# Altium integrated library WE-CMB_rev16a.intlib: 33 symbols
Pins are listed as number, name and electrical type; pins without a type are passive.

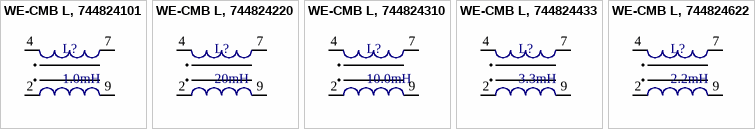
[diagram p0: symbols WE-CMB L, 744824101 to WE-CMB L, 744824622]

## WE-CMB L, 744824101
designator L?, comment 1.0mH
WE-CMB Common Mode Power Line Choke, L = 1.0mH; partNo: 744824101; Manufacturer: Wurth Elektronik; Inductance: 1.0mH; ComponentLink1Description: Manufacturer; ComponentLink1URL: http://www.we-online.de; Created by: Baojun Chen; Created Date: Feb.2016; ComponentLink2Description: Datasheet; ComponentLink2URL: http://katalog.we-online.de/pbs/datasheet/744824101.pdf
footprint WE-CMB_L (THT Inductor, 4-Leads, Body 27,5x18,5mm)
pins: 2, 4, 7, 9

## WE-CMB L, 744824220
designator L?, comment 20mH
WE-CMB Common Mode Power Line Choke, L = 20mH; partNo: 744824220; Manufacturer: Wurth Elektronik; Inductance: 20mH; ComponentLink1Description: Manufacturer; ComponentLink1URL: http://www.we-online.de; Created by: Baojun Chen; Created Date: Feb.2016; ComponentLink2Description: Datasheet; ComponentLink2URL: http://katalog.we-online.de/pbs/datasheet/744824220.pdf
footprint WE-CMB_L (THT Inductor, 4-Leads, Body 27,5x18,5mm)
pins: 2, 4, 7, 9

## WE-CMB L, 744824310
designator L?, comment 10.0mH
WE-CMB Common Mode Power Line Choke, L = 10.0mH; partNo: 744824310; Manufacturer: Wurth Elektronik; Inductance: 10.0mH; ComponentLink1Description: Manufacturer; ComponentLink1URL: http://www.we-online.de; Created by: Baojun Chen; Created Date: Feb.2016; ComponentLink2Description: Datasheet; ComponentLink2URL: http://katalog.we-online.de/pbs/datasheet/744824310.pdf
footprint WE-CMB_L (THT Inductor, 4-Leads, Body 27,5x18,5mm)
pins: 2, 4, 7, 9

## WE-CMB L, 744824433
designator L?, comment 3.3mH
WE-CMB Common Mode Power Line Choke, L = 3.3mH; partNo: 744824433; Manufacturer: Wurth Elektronik; Inductance: 3.3mH; ComponentLink1Description: Manufacturer; ComponentLink1URL: http://www.we-online.de; Created by: Baojun Chen; Created Date: Feb.2016; ComponentLink2Description: Datasheet; ComponentLink2URL: http://katalog.we-online.de/pbs/datasheet/744824433.pdf
footprint WE-CMB_L (THT Inductor, 4-Leads, Body 27,5x18,5mm)
pins: 2, 4, 7, 9

## WE-CMB L, 744824622
designator L?, comment 2.2mH
WE-CMB Common Mode Power Line Choke, L = 2.2mH; partNo: 744824622; Manufacturer: Wurth Elektronik; Inductance: 2.2mH; ComponentLink1Description: Manufacturer; ComponentLink1URL: http://www.we-online.de; Created by: Baojun Chen; Created Date: Feb.2016; ComponentLink2Description: Datasheet; ComponentLink2URL: http://katalog.we-online.de/pbs/datasheet/744824622.pdf
footprint WE-CMB_L (THT Inductor, 4-Leads, Body 27,5x18,5mm)
pins: 2, 4, 7, 9


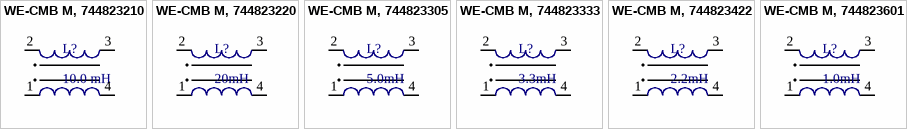
[diagram p1: symbols WE-CMB M, 744823210 to WE-CMB M, 744823601]

## WE-CMB M, 744823210
designator L?, comment 10.0 mH
WE-CMB Common Mode Power Line Choke, L = 10mH; partNo: 744823210; Manufacturer: Wurth Elektronik; Inductance: 10.0 mH; ComponentLink1Description: Manufacturer; ComponentLink1URL: http://www.we-online.de; Created by: Baojun Chen; Created Date: Feb.2016; ComponentLink2Description: Datasheet; ComponentLink2URL: http://katalog.we-online.de/pbs/datasheet/744823210.pdf
footprint WE-CMB_M_744823210 (THT Inductor, 4-Leads, Body 23,0x13.8,0mm)
pins: 1, 2, 3, 4

## WE-CMB M, 744823220
designator L?, comment 20mH
WE-CMB Common Mode Power Line Choke, L = 20mH; partNo: 744823220; Manufacturer: Wurth Elektronik; Inductance: 20mH; ComponentLink1Description: Manufacturer; ComponentLink1URL: http://www.we-online.de; Created by: Baojun Chen; Created Date: Feb.2016; ComponentLink2Description: Datasheet; ComponentLink2URL: http://katalog.we-online.de/pbs/datasheet/744823220.pdf
footprint WE-CMB_M_744823220 (THT Inductor, 4-Leads, Body 23,0x13.8mm)
pins: 1, 2, 3, 4

## WE-CMB M, 744823305
designator L?, comment 5.0mH
WE-CMB Common Mode Power Line Choke, L = 5.0mH; partNo: 744823305; Manufacturer: Wurth Elektronik; Inductance: 5.0mH; ComponentLink1Description: Manufacturer; ComponentLink1URL: http://www.we-online.de; Created by: Baojun Chen; Created Date: Feb.2016; ComponentLink2Description: Datasheet; ComponentLink2URL: http://katalog.we-online.de/pbs/datasheet/744823305.pdf
footprint WE-CMB_M_744823305 (THT Inductor, 4-Leads, Body 23,0x13.0mm)
pins: 1, 2, 3, 4

## WE-CMB M, 744823333
designator L?, comment 3.3mH
WE-CMB Common Mode Power Line Choke, L = 3.3mH; partNo: 744823333; Manufacturer: Wurth Elektronik; Inductance: 3.3mH; ComponentLink1Description: Manufacturer; ComponentLink1URL: http://www.we-online.de; Created by: Baojun Chen; Created Date: Feb.2016; ComponentLink2Description: Datasheet; ComponentLink2URL: http://katalog.we-online.de/pbs/datasheet/744823333.pdf
footprint WE-CMB_M_744823333 (THT Inductor, 4-Leads, Body 23,5x13.0mm)
pins: 1, 2, 3, 4

## WE-CMB M, 744823422
designator L?, comment 2.2mH
WE-CMB Common Mode Power Line Choke, L = 2.2mH; partNo: 744823422; Manufacturer: Wurth Elektronik; Inductance: 2.2mH; ComponentLink1Description: Manufacturer; ComponentLink1URL: http://www.we-online.de; Created by: Baojun Chen; Created Date: Feb.2016; ComponentLink2Description: Datasheet; ComponentLink2URL: http://katalog.we-online.de/pbs/datasheet/744823422.pdf
footprint WE-CMB_M_744823422 (THT Inductor, 4-Leads, Body 23,5x13.8mm)
pins: 1, 2, 3, 4

## WE-CMB M, 744823601
designator L?, comment 1.0mH
WE-CMB Common Mode Power Line Choke, L = 1.0mH; partNo: 744823601; Manufacturer: Wurth Elektronik; Inductance: 1.0mH; ComponentLink1Description: Manufacturer; ComponentLink1URL: http://www.we-online.de; Created by: Baojun Chen; Created Date: Feb.2016; ComponentLink2Description: Datasheet; ComponentLink2URL: http://katalog.we-online.de/pbs/datasheet/744823601.pdf
footprint WE-CMB_M_744823601 (THT Inductor, 4-Leads, Body 25.0x17mm)
pins: 1, 2, 3, 4


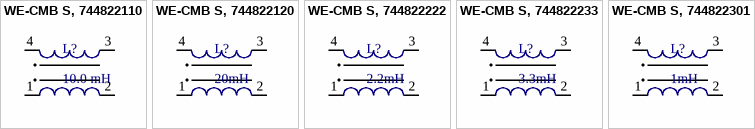
[diagram p2: symbols WE-CMB S, 744822110 to WE-CMB S, 744822301]

## WE-CMB S, 744822110
designator L?, comment 10.0 mH
WE-CMB Common Mode Power Line Choke, L = 10mH; partNo: 744822110; Manufacturer: Wurth Elektronik; Inductance: 10.0 mH; ComponentLink1Description: Manufacturer; ComponentLink1URL: http://www.we-online.de; Created by: Baojun Chen; Created Date: Feb.2016; ComponentLink2Description: Datasheet; ComponentLink2URL: http://katalog.we-online.de/pbs/datasheet/744822110.pdf
footprint WE-CMB_S (THT Inductor, 4-Leads, Body 17,5x13,0mm)
pins: 1, 2, 3, 4

## WE-CMB S, 744822120
designator L?, comment 20mH
WE-CMB Common Mode Power Line Choke, L = 20mH; partNo: 744822120; Manufacturer: Wurth Elektronik; Inductance: 20mH; ComponentLink1Description: Manufacturer; ComponentLink1URL: http://www.we-online.de; Created by: Baojun Chen; Created Date: Feb.2016; ComponentLink2Description: Datasheet; ComponentLink2URL: http://katalog.we-online.de/pbs/datasheet/744822120.pdf
footprint WE-CMB_S (THT Inductor, 4-Leads, Body 17,5x13,0mm)
pins: 1, 2, 3, 4

## WE-CMB S, 744822222
designator L?, comment 2.2mH
WE-CMB Common Mode Power Line Choke, L = 2.2mH; partNo: 744822222; Manufacturer: Wurth Elektronik; Inductance: 2.2mH; ComponentLink1Description: Manufacturer; ComponentLink1URL: http://www.we-online.de; Created by: Baojun Chen; Created Date: Feb.2016; ComponentLink2Description: Datasheet; ComponentLink2URL: http://katalog.we-online.de/pbs/datasheet/744822222.pdf
footprint WE-CMB_S (THT Inductor, 4-Leads, Body 17,5x13,0mm)
pins: 1, 2, 3, 4

## WE-CMB S, 744822233
designator L?, comment 3.3mH
WE-CMB Common Mode Power Line Choke, L = 3.3mH; partNo: 744822233; Manufacturer: Wurth Elektronik; Inductance: 3.3mH; ComponentLink1Description: Manufacturer; ComponentLink1URL: http://www.we-online.de; Created by: Baojun Chen; Created Date: Feb.2016; ComponentLink2Description: Datasheet; ComponentLink2URL: http://katalog.we-online.de/pbs/datasheet/744822233.pdf
footprint WE-CMB_S (THT Inductor, 4-Leads, Body 17,5x13,0mm)
pins: 1, 2, 3, 4

## WE-CMB S, 744822301
designator L?, comment 1mH
WE-CMB Common Mode Power Line Choke, L = 1mH; partNo: 744822301; Manufacturer: Wurth Elektronik; Inductance: 1mH; ComponentLink1Description: Manufacturer; ComponentLink1URL: http://www.we-online.de; Created by: Baojun Chen; Created Date: Feb.2016; ComponentLink2Description: Datasheet; ComponentLink2URL: http://katalog.we-online.de/pbs/datasheet/744822301.pdf
footprint WE-CMB_S (THT Inductor, 4-Leads, Body 17,5x13,0mm)
pins: 1, 2, 3, 4


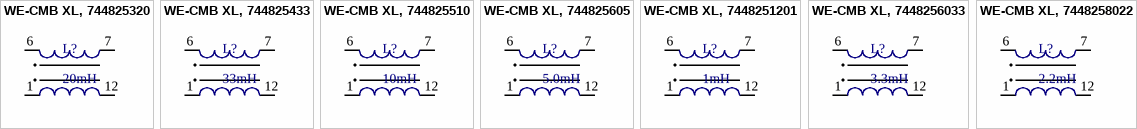
[diagram p3: symbols WE-CMB XL, 744825320 to WE-CMB XL, 7448258022]

## WE-CMB XL, 744825320
designator L?, comment 20mH
WE-CMB Common Mode Power Line Choke, L = 20mH; partNo: 744825320; Manufacturer: Wurth Elektronik; Inductance: 20mH; ComponentLink1Description: Manufacturer; ComponentLink1URL: http://www.we-online.de; Created by: Baojun Chen; Created Date: Feb.2016; ComponentLink2Description: Datasheet; ComponentLink2URL: http://katalog.we-online.de/pbs/datasheet/744825320.pdf
footprint WE-CMB_XL (THT Inductor, 4-Leads, Body 30,0x21,0mm)
pins: 1, 6, 7, 12

## WE-CMB XL, 744825433
designator L?, comment 33mH
WE-CMB Common Mode Power Line Choke, L = 33mH; partNo: 744825433; Manufacturer: Wurth Elektronik; Inductance: 33mH; ComponentLink1Description: Manufacturer; ComponentLink1URL: http://www.we-online.de; Created by: Baojun Chen; Created Date: Feb.2016; ComponentLink2Description: Datasheet; ComponentLink2URL: http://katalog.we-online.de/pbs/datasheet/744825433.pdf
footprint WE-CMB_XL (THT Inductor, 4-Leads, Body 30,0x21,0mm)
pins: 1, 6, 7, 12

## WE-CMB XL, 744825510
designator L?, comment 10mH
WE-CMB Common Mode Power Line Choke, L = 10mH; partNo: 744825510; Manufacturer: Wurth Elektronik; Inductance: 10mH; ComponentLink1Description: Manufacturer; ComponentLink1URL: http://www.we-online.de; Created by: Baojun Chen; Created Date: Feb.2016; ComponentLink2Description: Datasheet; ComponentLink2URL: http://katalog.we-online.de/pbs/datasheet/744825510.pdf
footprint WE-CMB_XL (THT Inductor, 4-Leads, Body 30,0x21,0mm)
pins: 1, 6, 7, 12

## WE-CMB XL, 744825605
designator L?, comment 5.0mH
WE-CMB Common Mode Power Line Choke, L = 5.0mH; partNo: 744825605; Manufacturer: Wurth Elektronik; Inductance: 5.0mH; ComponentLink1Description: Manufacturer; ComponentLink1URL: http://www.we-online.de; Created by: Baojun Chen; Created Date: Feb.2016; ComponentLink2Description: Datasheet; ComponentLink2URL: http://katalog.we-online.de/pbs/datasheet/744825605.pdf
footprint WE-CMB_XL (THT Inductor, 4-Leads, Body 30,0x21,0mm)
pins: 1, 6, 7, 12

## WE-CMB XL, 7448251201
designator L?, comment 1mH
WE-CMB Common Mode Power Line Choke, L = 1mH; partNo: 7448251201; Manufacturer: Wurth Elektronik; Inductance: 1mH; ComponentLink1Description: Manufacturer; ComponentLink1URL: http://www.we-online.de; Created by: Baojun Chen; Created Date: Feb.2016; ComponentLink2Description: Datasheet; ComponentLink2URL: http://katalog.we-online.de/pbs/datasheet/7448251201.pdf
footprint WE-CMB_XL_7448251201 (THT Inductor, 4-Leads, Body 31,0x22,0mm)
pins: 1, 6, 7, 12

## WE-CMB XL, 7448256033
designator L?, comment 3.3mH
WE-CMB Common Mode Power Line Choke, L = 3.3mH; partNo: 7448256033; Manufacturer: Wurth Elektronik; Inductance: 3.3mH; ComponentLink1Description: Manufacturer; ComponentLink1URL: http://www.we-online.de; Created by: Baojun Chen; Created Date: Feb.2016; ComponentLink2Description: Datasheet; ComponentLink2URL: http://katalog.we-online.de/pbs/datasheet/7448256033.pdf
footprint WE-CMB_XL (THT Inductor, 4-Leads, Body 30,0x21,0mm)
pins: 1, 6, 7, 12

## WE-CMB XL, 7448258022
designator L?, comment 2.2mH
WE-CMB Common Mode Power Line Choke, L = 2.2mH; partNo: 7448258022; Manufacturer: Wurth Elektronik; Inductance: 2.2mH; ComponentLink1Description: Manufacturer; ComponentLink1URL: http://www.we-online.de; Created by: Baojun Chen; Created Date: Feb.2016; ComponentLink2Description: Datasheet; ComponentLink2URL: http://katalog.we-online.de/pbs/datasheet/7448258022.pdf
footprint WE-CMB_XL (THT Inductor, 4-Leads, Body 30,0x21,0mm)
pins: 1, 6, 7, 12


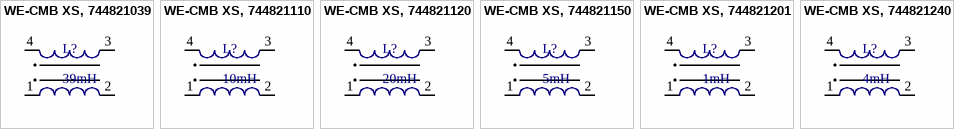
[diagram p4: symbols WE-CMB XS, 744821039 to WE-CMB XS, 744821240]

## WE-CMB XS, 744821039
designator L?, comment 39mH
WE-CMB Common Mode Power Line Choke, L = 39mH; partNo: 744821039; Manufacturer: Wurth Elektronik; Inductance: 39mH; ComponentLink1Description: Manufacturer; ComponentLink1URL: http://www.we-online.de; Created by: Baojun Chen; Created Date: Feb.2016; ComponentLink2Description: Datasheet; ComponentLink2URL: http://katalog.we-online.de/pbs/datasheet/744821039.pdf
footprint WE-CMB_XS (THT Inductor, 2-Leads, Body 15,0x7,5mm)
pins: 1, 2, 3, 4

## WE-CMB XS, 744821110
designator L?, comment 10mH
WE-CMB Common Mode Power Line Choke, L = 10mH; partNo: 744821110; Manufacturer: Wurth Elektronik; Inductance: 10mH; ComponentLink1Description: Manufacturer; ComponentLink1URL: http://www.we-online.de; Created by: Baojun Chen; Created Date: Feb.2016; ComponentLink2Description: Datasheet; ComponentLink2URL: http://katalog.we-online.de/pbs/datasheet/744821110.pdf
footprint WE-CMB_XS (THT Inductor, 2-Leads, Body 15,0x7,5mm)
pins: 1, 2, 3, 4

## WE-CMB XS, 744821120
designator L?, comment 20mH
WE-CMB Common Mode Power Line Choke, L = 20mH; partNo: 744821120; Manufacturer: Wurth Elektronik; Inductance: 20mH; ComponentLink1Description: Manufacturer; ComponentLink1URL: http://www.we-online.de; Created by: Baojun Chen; Created Date: Feb.2016; ComponentLink2Description: Datasheet; ComponentLink2URL: http://katalog.we-online.de/pbs/datasheet/744821120.pdf
footprint WE-CMB_XS_744821120 (THT Inductor, 2-Leads, Body 15,0x7,8mm)
pins: 1, 2, 3, 4

## WE-CMB XS, 744821150
designator L?, comment 5mH
WE-CMB Common Mode Power Line Choke, L = 5mH; partNo: 744821150; Manufacturer: Wurth Elektronik; Inductance: 5mH; ComponentLink1Description: Manufacturer; ComponentLink1URL: http://www.we-online.de; Created by: Baojun Chen; Created Date: Feb.2016; ComponentLink2Description: Datasheet; ComponentLink2URL: http://katalog.we-online.de/pbs/datasheet/744821150.pdf
footprint WE-CMB_XS_744821150 (THT Inductor, 2-Leads, Body 15,0x7,8mm)
pins: 1, 2, 3, 4

## WE-CMB XS, 744821201
designator L?, comment 1mH
WE-CMB Common Mode Power Line Choke, L = 1mH; partNo: 744821201; Manufacturer: Wurth Elektronik; Inductance: 1mH; ComponentLink1Description: Manufacturer; ComponentLink1URL: http://www.we-online.de; Created by: Baojun Chen; Created Date: Feb.2016; ComponentLink2Description: Datasheet; ComponentLink2URL: http://katalog.we-online.de/pbs/datasheet/744821201.pdf
footprint WE-CMB_XS (THT Inductor, 2-Leads, Body 15,0x7,5mm)
pins: 1, 2, 3, 4

## WE-CMB XS, 744821240
designator L?, comment 4mH
WE-CMB Common Mode Power Line Choke, L = 4mH; partNo: 744821240; Manufacturer: Wurth Elektronik; Inductance: 4mH; ComponentLink1Description: Manufacturer; ComponentLink1URL: http://www.we-online.de; Created by: Baojun Chen; Created Date: Feb.2016; ComponentLink2Description: Datasheet; ComponentLink2URL: http://katalog.we-online.de/pbs/datasheet/744821240.pdf
footprint WE-CMB_XS_744821240 (THT Inductor, 2-Leads, Body 15,8x7,8mm)
pins: 1, 2, 3, 4


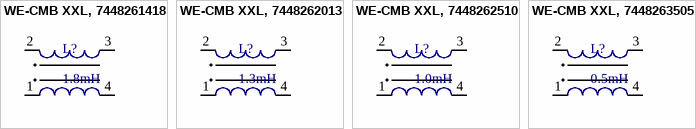
[diagram p5: symbols WE-CMB XXL, 7448261418 to WE-CMB XXL, 7448263505]

## WE-CMB XXL, 7448261418
designator L?, comment 1.8mH
WE-CMB Common Mode Power Line Choke, L = 1.8mH; partNo: 7448261418; Manufacturer: Wurth Elektronik; Inductance: 1.8mH; ComponentLink1Description: Manufacturer; ComponentLink1URL: http://www.we-online.de; Created by: Baojun Chen; Created Date: Feb.2016; ComponentLink2Description: Datasheet; ComponentLink2URL: http://katalog.we-online.de/pbs/datasheet/7448261418.pdf
footprint WE-CMB_XXL_7448261418 (THT Inductor, 4-Leads, Body 43,0x23,5mm)
pins: 1, 2, 3, 4

## WE-CMB XXL, 7448262013
designator L?, comment 1.3mH
WE-CMB Common Mode Power Line Choke, L = 1.3mH; partNo: 7448262013; Manufacturer: Wurth Elektronik; Inductance: 1.3mH; ComponentLink1Description: Manufacturer; ComponentLink1URL: http://www.we-online.de; Created by: Baojun Chen; Created Date: Feb.2016; ComponentLink2Description: Datasheet; ComponentLink2URL: http://katalog.we-online.de/pbs/datasheet/7448262013.pdf
footprint WE-CMB_XXL_7448262013 (THT Inductor, 4-Leads, Body 43,5x23,5mm)
pins: 1, 2, 3, 4

## WE-CMB XXL, 7448262510
designator L?, comment 1.0mH
WE-CMB Common Mode Power Line Choke, L = 1.0mH; partNo: 7448262510; Manufacturer: Wurth Elektronik; Inductance: 1.0mH; ComponentLink1Description: Manufacturer; ComponentLink1URL: http://www.we-online.de; Created by: Baojun Chen; Created Date: Feb.2016; ComponentLink2Description: Datasheet; ComponentLink2URL: http://katalog.we-online.de/pbs/datasheet/7448262510.pdf
footprint WE-CMB_XXL_7448262510 (THT Inductor, 4-Leads, Body 44,0x23,5mm)
pins: 1, 2, 3, 4

## WE-CMB XXL, 7448263505
designator L?, comment 0.5mH
WE-CMB Common Mode Power Line Choke, L = 0.5mH; partNo: 7448263505; Manufacturer: Wurth Elektronik; Inductance: 0.5mH; ComponentLink1Description: Manufacturer; ComponentLink1URL: http://www.we-online.de; Created by: Baojun Chen; Created Date: Feb.2016; ComponentLink2Description: Datasheet; ComponentLink2URL: http://katalog.we-online.de/pbs/datasheet/7448263505.pdf
footprint WE-CMB_XXL_7448263505 (THT Inductor, 4-Leads, Body 47,0x23,5mm)
pins: 1, 2, 3, 4